# Altium footprint library 集大电协1.5.PcbLib: 227 footprints (part 14 of 18)
Each footprint in its own frame and in the unit in brackets; x right, y up, seen from the top. Pads: shape width x height; smd on the part's side, far side on the other; paste and mask are expansions set on the pad; w line width, h text height; cw(c..) or ccw(c..) is an arc to the next point about the centre after c.
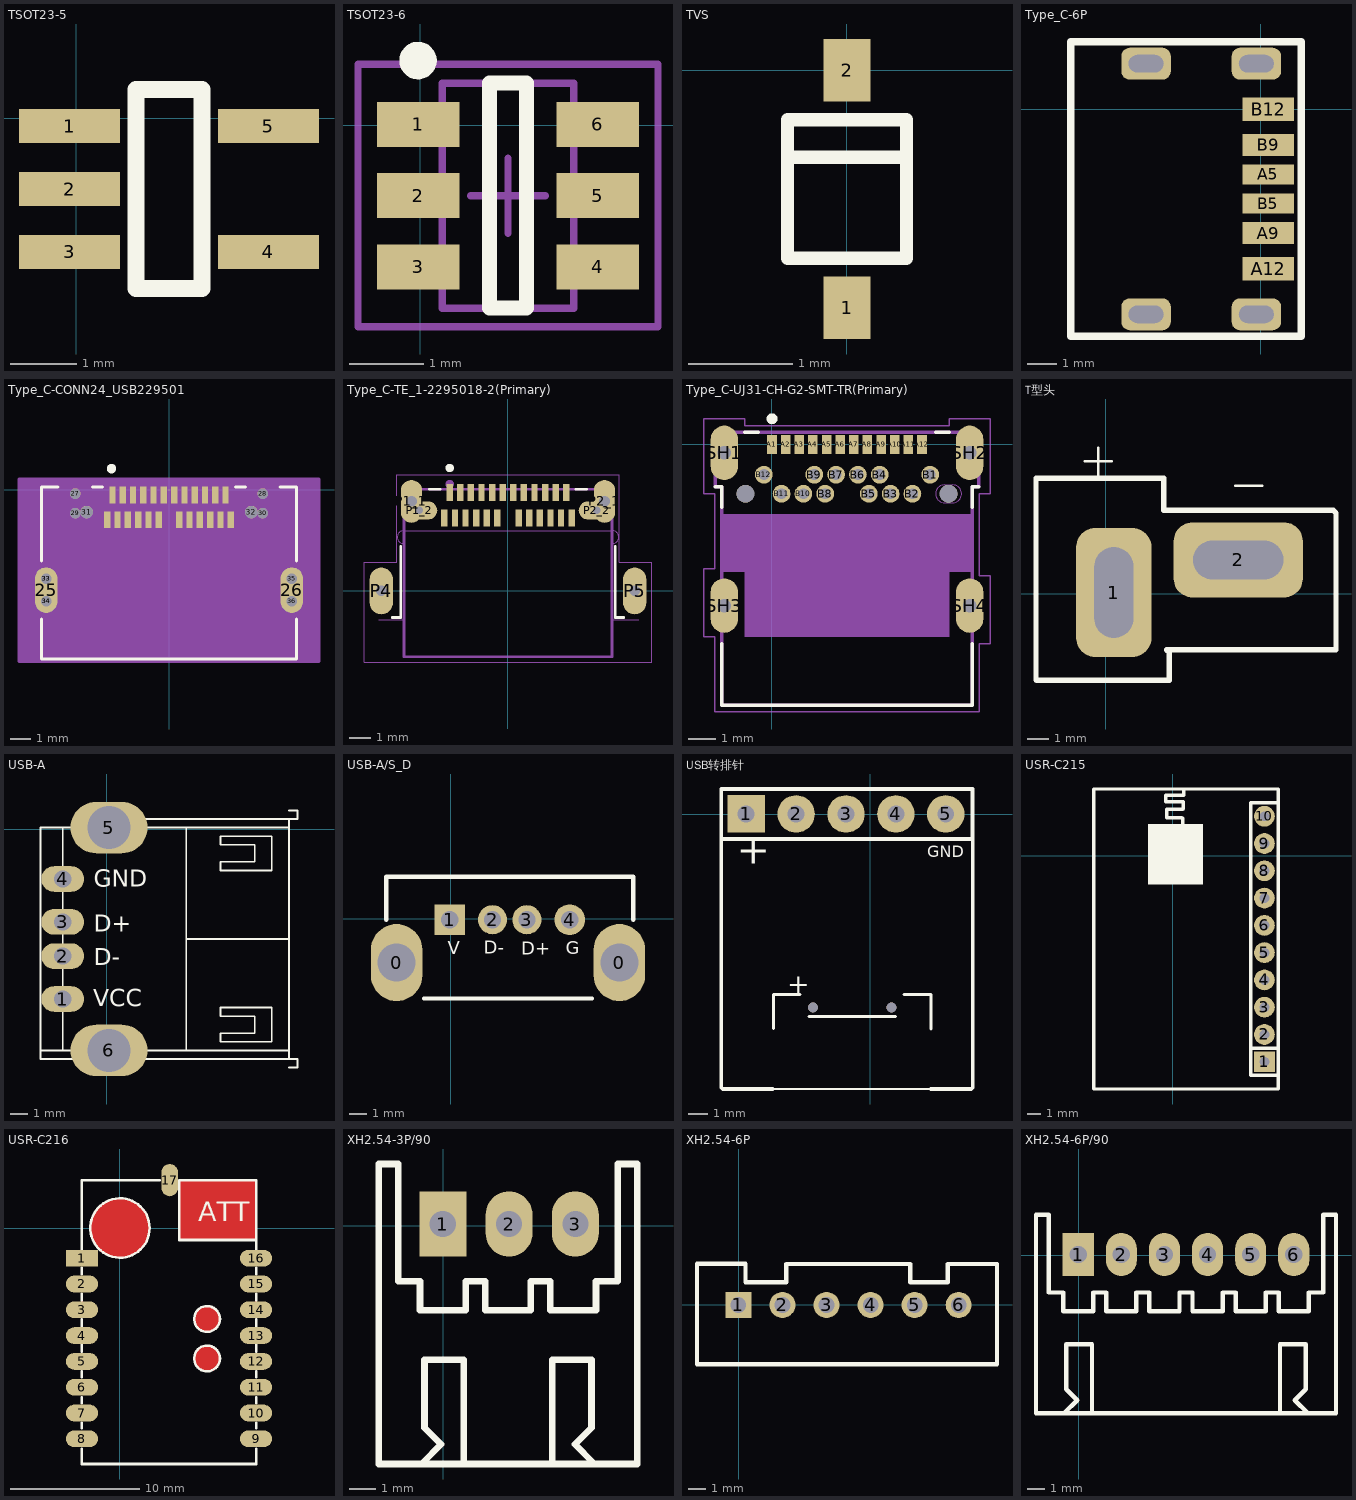
[diagram p13: the footprints below, top view; thin cyan lines are the x and y axes]

## TSOT23-5 [mil]
pads (5):
  rect 60x20 smd: 1(-4.06,-4.53) 2(-4.06,-41.93) 3(-4.06,-79.33) 4(114.06,-79.33) 5(114.06,-4.53)
Top Overlay:
  lines w10: 35.31,-100.98 35.31,17.13 74.69,17.13 74.69,-100.98 35.31,-100.98
3D body: height 47.24, standoff 0, extent 1,-98.09 111.23,16.09

## TSOT23-6 [mm]
pads (6):
  rect 1.1x0.6 smd: 1(-0.032,0.01) 2(-0.032,-0.94) 3(-0.032,-1.89) 4(2.368,-1.89) 5(2.368,-0.94) 6(2.368,0.01)
Top Overlay:
  circle w0.25: c-0.032,0.86 r0.125
  lines w0.2: 0.918,-2.44 1.418,-2.44 1.418,0.56 0.918,0.56 0.918,-2.44
Mechanical 13:
  lines w0.1: 0.293,-2.44 0.293,0.56 2.043,0.56 2.043,-2.44 0.293,-2.44
Mechanical 15:
  lines w0.1: 0.668,-0.94 1.668,-0.94 ; 1.168,-1.44 1.168,-0.44 ; -0.832,-2.69 -0.832,0.81 3.168,0.81 3.168,-2.69 -0.832,-2.69
3D body: height 1.45, standoff 0, extent 0.293,-2.44 2.043,0.56

## TVS [mm]
pads (2):
  rect 0.45x0.6 smd: 1(0.003,-2.286) 2(0.003,0)
Top Overlay:
  lines w0.127: -0.555,-0.838 0.562,-0.838 ; -0.57,-1.809 0.576,-1.809 0.576,-0.477 -0.57,-0.477 -0.57,-1.809
3D body "SOD-323.STEP": height 1, standoff 0, extent -0.65,-2.45 0.65,0.15

## Type_C-6P [mm]
pads (10):
  rect 1.778x0.7 smd: A5(0.254,-2.25) B5(0.254,-3.25)
  rect 1.778x0.76 smd: A9(0.254,-4.27) B9(0.254,-1.23)
  rect 1.778x0.8 smd: A12(0.254,-5.5) B12(0.254,0)
  rrect50% 1.7x1.1 hole 0.6 slot 1.2 at 0 deg: ""(-3.95,-7.07) ""(-3.95,1.57) ""(-0.15,-7.07) ""(-0.15,1.57)
Top Overlay:
  lines w0.254: -6.547,-7.83 -6.547,2.33 1.397,2.33 1.397,-7.83 -6.547,-7.83
3D body "USB TYPE-C 3.1smple.STEP": height 3.18, standoff -0.9, extent -6.589,-7.22 0.311,1.72

## Type_C-CONN24_USB229501 [mil]
pads (38):
  oval 43x87 smd: 25(-235.04,-192.52) 26(235.04,-192.52)
  round 20 hole 20: 27(-179.13,-7.68) 28(179.13,-7.68) 29(-179.13,-45.12) 30(179.13,-45.12) 33(-235.04,-171.02) 33(-235.04,-171.02) 34(-235.04,-214.02) 34(-235.04,-214.02) 35(235.04,-171.02) 36(235.04,-214.02)
  round 24 hole 24: 31(-157.48,-43.11) 32(157.48,-43.11)
  rect 12x32 smd paste+0 mask+0: A1(-108.27,-10.47) A2(-88.58,-10.47) A3(-68.9,-10.47) A4(-49.21,-10.47) A5(-29.53,-10.47) A6(-9.84,-10.47) A7(9.84,-10.47) A8(29.53,-10.47) A9(49.21,-10.47) A10(68.9,-10.47) A11(88.58,-10.47) A12(108.27,-10.47) B1(118.11,-57.72) B2(98.43,-57.72) B3(78.74,-57.72) B4(59.06,-57.72) B5(39.37,-57.72) B6(19.68,-57.72) B7(-19.68,-57.72) B8(-39.37,-57.72) B9(-59.06,-57.72) B10(-78.74,-57.72) B11(-98.43,-57.72) B12(-118.11,-57.72)
Top Overlay:
  circle w10: c-110,40 r4
  lines w6: -244,-247.94 -244,-324 244,-324 244,-247.94 ; -244,-137.1 -244,5 -212.23,5 ; -146.03,5 -127.1,5 ; 127.1,5 146.03,5 ; 212.23,5 244,5 244,-137.1
Bottom Overlay:
  circle w10: c-110,40 r4
Mechanical 13:
  circle w5: c-110,40 r4
  lines w1: -239,-319 -239,0 239,0 239,-319 -239,-319
Mechanical 15:
  region: 287,20 -287,20 -287,-329 287,-329
  region: 239,0 -239,0 -239,-319 239,-319
  lines w6: -287,-329 287,-329 287,20 -287,20 -287,-329
Multi-Layer:
  lines w1: -189.13,-45.12 -189.13,-7.68 ; -179.13,-55.12 -157.48,-55.11 ; -169.13,-7.68 -169.13,-31.11 -157.48,-31.11 ; 157.48,-55.11 179.13,-55.12 ; 157.48,-31.11 169.13,-31.11 169.13,-7.68 ; 189.13,-45.12 189.13,-7.68 ; -245.04,-214.02 -245.04,-171.02 -245.04,-214.02 ; -225.04,-214.02 -225.04,-171.02 -225.04,-214.02 ; -194,-319 194,-319 194,-91 -194,-91 -194,-319 ; 225.04,-214.02 225.04,-171.02 225.04,-214.02 ; 245.04,-214.02 245.04,-171.02 245.04,-214.02
3D body "c-2295018-2-a-3d.stp": height 96.06, standoff -45.67, extent -238.97,-315.86 238.99,2.84

## Type_C-TE_1-2295018-2(Primary) [mm]
pads (30):
  rect 0.3x0.8 smd: A1(-2.75,4.63) A2(-2.25,4.63) A3(-1.75,4.63) A4(-1.25,4.63) A5(-0.75,4.63) A6(-0.25,4.63) A7(0.25,4.63) A8(0.75,4.63) A9(1.25,4.63) A10(1.75,4.63) A11(2.25,4.63) A12(2.75,4.63) B1(3,3.43) B2(2.5,3.43) B3(2,3.43) B4(1.5,3.43) B5(1,3.43) B6(0.5,3.43) B7(-0.5,3.43) B8(-1,3.43) B9(-1.5,3.43) B10(-2,3.43) B11(-2.5,3.43) B12(-3,3.43)
  oval 1.008x2.016 hole 0.5: P1_1(-4.55,4.22) P2_1(4.55,4.22)
  oval 1.716x0.858 hole 0.35: P1_2(-4.191,3.795) P2_2(4.191,3.795)
  oval 1.1x2.2 hole 0.5: P4(-5.97,0) P5(5.97,0)
Top Overlay:
  circle w0.2: c-2.75,5.795 r0.1
  lines w0.127: -5.45,-1.25 -5.05,-1.25 -5.05,2.1 ; -3.7,4.795 -3.2,4.795 ; 3.2,4.795 3.7,4.795 ; 5.05,2.1 5.05,-1.25 5.45,-1.25
Mechanical 1:
  lines w0: -6.09,-1.36 -4.92,-1.36 -4.92,2.24 cw(c-4.92,2.54) -5.22,2.54 cw(c-4.92,2.54) -4.92,2.84 4.93,2.84 cw(c4.925,2.545) 5.22,2.54 ; -4.3,4.25 -4.3,4.695 ccw(c-4.55,4.695) -4.55,4.945 ccw(c-4.55,4.695) -4.8,4.695 -4.8,3.745 ccw(c-4.55,3.745) -4.55,3.495 -4,3.495 ccw(c-4,3.795) -3.7,3.795 ; -4.3,4.25 ccw(c-4.15,4.245) -4.155,4.095 -4.005,4.095 ; -4.002,4.095 cw(c-4.002,3.792) -3.7,3.792 ; 4.3,4.25 4.3,4.695 cw(c4.55,4.695) 4.55,4.945 cw(c4.55,4.695) 4.8,4.695 4.8,3.745 cw(c4.55,3.745) 4.55,3.495 4,3.495 cw(c4,3.795) 3.7,3.795 cw(c4,3.795) 4,4.095 4.155,4.095 ccw(c4.15,4.245) 4.3,4.25 ; 4.919,2.24 ccw(c4.929,2.531) 5.22,2.541 ; 4.92,2.24 4.92,-1.36 6.17,-1.36 ; -6.22,-0.55 ccw(c-5.97,-0.55) -5.97,-0.8 ccw(c-5.97,-0.55) -5.72,-0.55 -5.72,0.55 ccw(c-5.97,0.55) -5.97,0.8 ccw(c-5.97,0.55) -6.22,0.55 -6.22,-0.55 ; 5.72,-0.55 ccw(c5.97,-0.55) 5.97,-0.8 ccw(c5.97,-0.55) 6.22,-0.55 6.22,0.55 ccw(c5.97,0.55) 5.97,0.8 ccw(c5.97,0.55) 5.72,0.55 5.72,-0.55
Mechanical 4:
  circle w0.2: c-2.75,5.035 r0.1
  circle w0.2: c-2.75,5.035 r0.1
  lines w0.127: -4.9,-3.105 -4.9,4.795 ; -4.9,-3.105 4.9,-3.105 ; -4.9,-3.105 -4.9,4.795 ; -4.9,-3.105 4.9,-3.105 ; -4.9,4.795 4.9,4.795 ; -4.9,4.795 4.9,4.795 ; 4.9,-3.105 4.9,4.795 ; 4.9,-3.105 4.9,4.795
Mechanical 16:
  lines w0.05: -6.77,-3.355 -6.77,1.35 -5.25,1.35 -5.25,5.48 5.25,5.48 5.25,1.35 6.77,1.35 6.77,-3.355 -6.77,-3.355
3D body "c-1-2295018-2-a-3d.stp": height 2.5, standoff -1.1, extent -6.07,-3.142 6.07,4.953

## Type_C-UJ31-CH-G2-SMT-TR(Primary) [mm]
pads (30):
  rect 0.35x0.7 smd: A1(0,0) A2(0.5,0) A3(1,0) A4(1.5,0) A5(2,0) A6(2.5,0) A7(3,0) A8(3.5,0) A9(4,0) A10(4.5,0) A11(5,0) A12(5.5,0)
  round 0.65 hole 0.4: B1(5.8,-1.11) B2(5.15,-1.81) B3(4.35,-1.81) B4(3.95,-1.11) B5(3.55,-1.81) B6(3.15,-1.11) B7(2.35,-1.11) B8(1.95,-1.81) B9(1.55,-1.11) B10(1.15,-1.81) B11(0.35,-1.81) B12(-0.3,-1.11)
  round 0.65 hole 0.65 unplated: None(-0.975,-1.81) None(6.475,-1.81)
  oval 1x2 hole 0.5: SH1(-1.75,-0.31) SH2(7.25,-0.31) SH3(-1.75,-5.91) SH4(7.25,-5.91)
Top Overlay:
  circle w0.2: c0,0.94 r0.1
  lines w0.127: -2.075,-1.56 -1.85,-1.56 -1.85,-2.31 ; -1.85,-7.31 -1.85,-9.56 7.35,-9.56 7.35,-7.31 ; -1,0.44 -0.5,0.44 ; 6,0.44 6.5,0.44 ; 7.35,-2.31 7.35,-1.56 7.575,-1.56
Mechanical 1:
  lines w0: -2,-6.31 ccw(c-1.75,-6.31) -1.5,-6.31 -1.5,-5.51 ccw(c-1.75,-5.51) -2,-5.51 -2,-6.31 ; -2,-0.61 ccw(c-1.75,-0.61) -1.5,-0.61 -1.5,-0.01 ccw(c-1.75,-0.01) -2,-0.01 -2,-0.61 ; 6.325,-2.135 cw(c6.325,-1.81) 6.325,-1.485 6.625,-1.485 cw(c6.625,-1.81) 6.625,-2.135 6.325,-2.135 ; 7,-6.31 ccw(c7.25,-6.31) 7.5,-6.31 7.5,-5.51 ccw(c7.25,-5.51) 7,-5.51 7,-6.31 ; 7,-0.61 ccw(c7.25,-0.61) 7.5,-0.61 7.5,-0.01 ccw(c7.25,-0.01) 7,-0.01 7,-0.61
Mechanical 4:
  region: -1.85,-2.56 7.35,-2.56 7.35,-4.66 6.5,-4.66 6.5,-7.06 -1,-7.06 -1,-4.66 -1.85,-4.66
  region: -1.85,-2.56 7.35,-2.56 7.35,-4.66 6.5,-4.66 6.5,-7.06 -1,-7.06 -1,-4.66 -1.85,-4.66
  region: -1.85,-2.56 7.35,-2.56 7.35,-4.66 6.5,-4.66 6.5,-7.06 -1,-7.06 -1,-4.66 -1.85,-4.66
  region: -1.85,-2.56 7.35,-2.56 7.35,-4.66 6.5,-4.66 6.5,-7.06 -1,-7.06 -1,-4.66 -1.85,-4.66
  lines w0.127: -2.075,-1.56 -2.075,0.44 ; -2.075,-1.56 -1.85,-1.56 ; -2.075,-1.56 -2.075,0.44 ; -2.075,-1.56 -1.85,-1.56 ; -2.075,0.44 7.575,0.44 ; -2.075,0.44 7.575,0.44 ; -1.85,-9.56 -1.85,-1.56 ; -1.85,-9.56 7.35,-9.56 ; -1.85,-9.56 -1.85,-1.56 ; -1.85,-9.56 7.35,-9.56 ; 7.35,-9.56 7.35,-1.56 ; 7.35,-9.56 7.35,-1.56 ; 7.35,-1.56 7.575,-1.56 ; 7.35,-1.56 7.575,-1.56 ; 7.575,-1.56 7.575,0.44 ; 7.575,-1.56 7.575,0.44
Mechanical 16:
  lines w0.05: -2.5,-7.06 -2.5,-4.56 -2.1,-4.56 -2.1,-1.81 -2.5,-1.81 -2.5,0.94 -1,0.94 -1,0.69 6.5,0.69 6.5,0.94 8,0.94 8,-1.81 7.6,-1.81 7.6,-4.81 8,-4.81 8,-7.31 7.6,-7.31 7.6,-9.81 -2.1,-9.81 -2.1,-7.06 -2.5,-7.06
3D body "CUI_UJ31-CH-G2-SMT-TR.step": height 4.5, standoff -1.16, extent -2.062,-9.612 7.65,0.388

## T型头 [mm]
pads (2):
  rrect50% 3.5x6 hole 1.8 slot 4.2 at 90 deg: 1(0.373,0.053)
  rrect50% 6x3.5 hole 1.8 slot 4.2 at 0 deg: 2(6.157,1.566)
Top Overlay:
  lines w0.1: -0.986,6.154 0.284,6.154 ; -0.351,5.519 -0.351,6.789 ; 5.999,5.011 7.269,5.011
  lines w0.254: -3.243,-4.006 -3.243,5.366 2.697,5.366 2.697,3.868 10.571,3.868 10.698,3.741 10.698,-2.609 2.824,-2.609 2.951,-2.736 2.951,-4.034 -3.215,-4.034 -3.243,-4.006
3D body "User Library-Deans.step": height 14.1, standoff -4.9, extent -2.665,-3.157 9.335,4.143

## USB-A [mm]
pads (6):
  oval 2.5x1.5 hole 1: 1(-2.569,-9.89) 2(-2.569,-7.39) 3(-2.569,-5.39) 4(-2.569,-2.89)
  oval 4.5x3 hole 2.5: 5(0.131,0.11) 6(0.131,-12.89)
Top Overlay:
  lines w0.1: -3.869,-12.89 0.131,-12.89 ; -2.569,-12.89 -2.569,0.11 ; -0.869,0.61 10.631,0.61 ; 0.131,-13.39 0.131,-12.89 ; 0.131,0.61 0.131,0.11 10.631,0.11 -2.569,0.11 ; 4.631,-12.89 4.631,0.11 ; 4.631,-6.39 10.631,-6.39 10.631,0.61 ; 10.631,-13.89 11.131,-13.89 11.131,-13.39 10.631,-13.39 ; 10.631,-12.89 0.131,-12.89 ; 10.631,1.11 11.131,1.11 11.131,0.61 10.631,0.61 ; -2.569,0.11 -3.869,0.11 -3.869,-6.39 -3.869,-13.39 10.631,-13.39 ; 10.631,-13.39 10.631,0.61 ; 6.631,-12.39 6.631,-11.89 8.631,-11.89 8.631,-10.89 6.631,-10.89 6.631,-10.39 9.631,-10.39 9.631,-11.89 9.631,-12.39 6.631,-12.39 ; 6.631,-2.39 6.631,-1.89 8.631,-1.89 8.631,-0.89 6.631,-0.89 6.631,-0.39 9.631,-0.39 9.631,-1.89 9.631,-2.39 6.631,-2.39
  text "VCC" at -0.8,-10.325 h1
  text "GND" at -0.75,-3.35 h1
  text "D+" at -0.75,-5.975 h1
  text "D-" at -0.75,-7.925 h1
Bottom Overlay:
  lines w0.1: -3.869,-12.89 10.631,-12.89 ; -2.569,-12.89 -2.569,0.11 ; 4.631,-6.39 10.631,-6.39 ; 10.631,-13.89 11.131,-13.89 11.131,-13.39 -3.869,-13.39 -3.869,0.11 ; 10.631,-13.39 10.631,-12.89 ; 10.631,1.11 11.131,1.11 11.131,0.61 10.631,0.61 ; -3.869,0.11 -3.869,0.61 10.631,0.61 ; -3.869,0.11 10.631,0.11 10.631,0.61 ; 10.631,-12.89 10.631,0.61
3D body "USB-A_SA.STEP": height 6.8, standoff -4.31, extent -3.325,-13.742 10.98,0.942

## USB-A/S_D [mm]
pads (6):
  oval 3x4.5 hole 2.2: 0(-3.169,-2.548) 0(9.831,-2.548)
  rect 1.8x1.8 hole 1: 1(-0.069,-0.048)
  round 1.7 hole 1: 2(2.431,-0.048) 3(4.431,-0.048)
  round 1.8 hole 1: 4(6.931,-0.048)
Top Overlay:
  lines w0.254: -3.769,-0.048 -3.769,2.452 10.631,2.452 10.631,-0.048 ; -1.569,-4.648 8.231,-4.648
  text "D-" at 1.927,-2.029 h0.76
  text "D+" at 4.112,-2.08 h0.76
  text "G" at 6.702,-2.055 h0.76
  text "V" at -0.181,-2.055 h0.76
Mechanical 1:
  lines w0.254: -0.269,-0.248 cw(c-0.069,-0.248) -0.069,-0.048
3D body "USB-A_S-D.STEP": height 14, standoff -4, extent -3.713,-4.635 10.687,2.365

## USB转排针 [mm]
pads (7):
  rect 1.905x1.905 hole 0.864: 1(-6.316,0.014)
  round 1.905 hole 0.864: 2(-3.776,0.014) 3(-1.236,0.014) 4(1.304,0.014) 5(3.839,0.014)
  round 0.5 hole 0.5 unplated: ""(-2.923,-9.834) ""(1.077,-9.834)
Top Overlay:
  lines w0.1: -4.973,-13.984 3.077,-13.984
  lines w0.152: -4.923,-10.9 -4.923,-9.184 -3.573,-9.184 ; -3.123,-10.284 1.277,-10.284 ; 1.727,-9.184 3.077,-9.184 3.077,-10.934
  lines w0.2: -4.973,-13.984 -7.502,-13.984 -7.586,-13.9 -7.586,-1.256 ; 3.077,-13.984 5.13,-13.984 ; 5.214,-13.9 5.214,-1.256 ; -7.586,-1.256 5.2,-1.256 5.2,1.284 -7.586,1.284 -7.586,-1.256
  text "GND" at 2.9,-2.4 h1.02
  text "+" at -4.223,-9.134 h1
  text "+" at -6.8,-3 h2.54
3D body "MICRO-USB.stp": height 2.47, standoff -0.92, extent -4.875,-14.1 3.075,-8.324
3D body "HDR1X5_2.54mm.STEP": height 8.54, standoff -3, extent -7.591,-1.256 5.109,1.284

## USR-C215 [mil]
pads (10):
  rect 60x60 hole 28: 1(264.14,-593.99)
  round 60 hole 28: 2(264.14,-515.25) 3(264.14,-436.51) 4(264.14,-357.77) 5(264.14,-279.03) 6(264.14,-200.29) 7(264.14,-121.55) 8(264.14,-42.81) 9(264.14,35.93) 10(264.14,114.67)
Top Overlay:
  circle w10: c16.75,46.74 r32.8
  rectangle: -71.86,-81.99 86.14,92.01
  lines w10: 27.75,80.74 27.75,108.74 25.75,110.74 -18.25,110.74 -18.25,134.74 28.75,134.74 29.75,135.74 29.75,156.74 -20.25,156.74 -20.25,174.74 31.75,174.74 31.75,190.74 ; 224.77,-554.62 303.51,-554.62 ; -227.99,-672.73 -227.99,193.41 303.51,193.41 303.51,-672.73 -227.99,-672.73 ; 224.77,-633.36 224.77,154.04 303.51,154.04 303.51,-633.36 224.77,-633.36
3D body: height 30, standoff 0, extent -227,-672 303,193
3D body: height 40, standoff 30, extent -72,-83 85,90
3D body: height 40, standoff 10, extent -22.25,9.74 53.75,84.74

## USR-C216 [mm] "有人公司WIFI模组 USR-C216"
pads (17):
  rect 2.5x1.3 smd: 1(-2.945,-2.325)
  oval 2.5x1.3 smd: 2(-2.945,-4.325) 3(-2.945,-6.325) 4(-2.945,-8.325) 5(-2.945,-10.325) 6(-2.945,-12.325) 7(-2.945,-14.325) 8(-2.945,-16.325) 9(10.555,-16.325) 10(10.555,-14.325) 11(10.555,-12.325) 12(10.555,-10.325) 13(10.555,-8.325) 14(10.555,-6.325) 15(10.555,-4.325) 16(10.555,-2.325)
  oval 1.3x2.5 smd: 17(3.855,3.725)
Top Layer:
  pour cut-out: 6.755,-9.085 6.853,-9.085 7.047,-9.123 7.229,-9.199 7.392,-9.308 7.532,-9.448 7.641,-9.611 7.717,-9.793 7.755,-9.987 7.755,-10.085 7.755,-10.105 7.755,-10.203 7.717,-10.397 7.641,-10.579 7.532,-10.742 7.392,-10.882 7.229,-10.991 7.047,-11.067 6.853,-11.105 6.755,-11.105 6.657,-11.105 6.463,-11.067 6.281,-10.991 6.118,-10.882 5.978,-10.742 5.869,-10.579 5.793,-10.397 5.755,-10.203 5.755,-10.105 5.755,-10.085 5.755,-9.987 5.793,-9.793 5.869,-9.611 5.978,-9.448 6.118,-9.308 6.281,-9.199 6.463,-9.123 6.657,-9.085
  pour cut-out: 6.755,-6.035 6.853,-6.035 7.047,-6.073 7.229,-6.149 7.392,-6.258 7.532,-6.398 7.641,-6.561 7.717,-6.743 7.755,-6.937 7.755,-7.035 7.755,-7.133 7.717,-7.327 7.641,-7.509 7.532,-7.672 7.392,-7.812 7.229,-7.921 7.047,-7.997 6.853,-8.035 6.755,-8.035 6.657,-8.035 6.463,-7.997 6.281,-7.921 6.118,-7.812 5.978,-7.672 5.869,-7.509 5.793,-7.327 5.755,-7.133 5.755,-7.035 5.755,-7.025 5.755,-6.927 5.793,-6.736 5.868,-6.556 5.976,-6.394 6.114,-6.256 6.276,-6.148 6.456,-6.073 6.647,-6.035 6.745,-6.035
  pour cut-out: 4.611,3.725 4.611,-0.905 10.555,-0.905 10.555,3.725
  pour cut-out: 0.015,2.305 0.241,2.305 0.683,2.217 1.1,2.044 1.475,1.794 1.794,1.475 2.044,1.1 2.217,0.683 2.305,0.241 2.305,0.015 2.305,-0.212 2.217,-0.656 2.043,-1.074 1.792,-1.451 1.471,-1.772 1.094,-2.023 0.676,-2.197 0.232,-2.285 0.005,-2.285 -0.015,-2.285 -0.241,-2.285 -0.683,-2.197 -1.1,-2.024 -1.475,-1.774 -1.794,-1.455 -2.044,-1.08 -2.217,-0.663 -2.305,-0.221 -2.305,0.005 -2.305,0.025 -2.305,0.25 -2.217,0.69 -2.046,1.105 -1.796,1.478 -1.478,1.796 -1.105,2.046 -0.69,2.217 -0.25,2.305 -0.025,2.305
Top Overlay:
  circle w0.2: c6.755,-7.035 r1
  circle w0.2: c6.755,-10.095 r1
  circle w0.2: c0.005,0.015 r2.3
  lines w0.203: -2.945,-17.081 -2.945,-18.275 10.555,-18.275 10.555,-17.081 ; -2.945,-15.506 -2.945,-15.075 ; -2.945,-13.576 -2.945,-13.093 ; -2.945,-11.544 -2.945,-11.087 ; -2.945,-9.588 -2.945,-9.055 ; -2.945,-7.582 -2.945,-7.074 ; -2.945,-5.6 -2.945,-5.067 ; -2.945,-3.568 -2.945,-3.086 ; -2.945,-1.638 -2.945,3.725 3.087,3.725 ; 10.555,-15.506 10.555,-15.075 ; 10.555,-13.576 10.555,-13.093 ; 10.555,-11.544 10.555,-11.087 ; 10.555,-9.588 10.555,-9.055 ; 10.555,-7.582 10.555,-7.074 ; 10.555,-5.6 10.555,-5.067 ; 10.555,-3.568 10.555,-3.086 ; 10.555,-1.638 10.555,3.725 4.611,3.725 4.611,-0.915 10.555,-0.915
  text "ATT" at 6.059,0.525 h1.52
3D body: height 1, standoff 0, extent -3.035,-18.185 10.535,3.725

## XH2.54-3P/90 [mm]
pads (3):
  rect 1.8x2.5 hole 1: 1(-0.02,0.065)
  oval 1.8x2.5 hole 1: 2(2.52,0.065) 3(5.06,0.065)
Top Overlay:
  lines w0.254: -0.81,-9.107 -0.083,-8.381 -0.72,-7.744 -0.72,-5.135 0.78,-5.135 0.78,-9.135 ; 4.18,-9.135 4.18,-5.135 5.68,-5.135 5.68,-7.744 5.044,-8.381 5.77,-9.107 ; -2.47,-9.135 7.43,-9.135 7.43,2.365 6.68,2.365 6.68,-2.135 5.855,-2.135 5.855,-3.235 4.105,-3.235 4.105,-2.135 3.355,-2.135 3.355,-3.235 1.605,-3.235 1.605,-2.135 0.855,-2.135 0.855,-3.235 -0.895,-3.235 -0.895,-2.135 -1.72,-2.135 -1.72,2.365 -2.47,2.365 -2.47,-9.135
3D body "JST-S3B-XH-A.STEP": height 6.1, standoff -3.4, extent -2.47,-9.135 7.43,2.365

## XH2.54-6P [mm]
pads (6):
  rect 1.5x1.5 hole 0.9: 1(-0.018,-0.022)
  round 1.5 hole 0.9: 2(2.522,-0.022) 3(5.062,-0.022) 4(7.602,-0.022) 5(10.142,-0.022) 6(12.682,-0.022)
Top Overlay:
  lines w0.254: -2.406,-3.451 14.891,-3.451 14.891,2.34 12.047,2.34 12.047,1.299 9.888,1.299 9.888,2.34 2.75,2.34 2.75,1.299 0.388,1.299 0.388,2.366 -2.406,2.366 -2.406,-3.451
3D body "6pin-2.5.step": height 7, standoff -3.4, extent -2.495,-3.405 14.905,2.345

## XH2.54-6P/90 [mm]
pads (6):
  rect 1.8x2.5 hole 1: 1(-0.015,0.035)
  oval 1.8x2.5 hole 1: 2(2.485,0.035) 3(4.985,0.035) 4(7.485,0.035) 5(9.985,0.035) 6(12.485,0.035)
Top Overlay:
  lines w0.254: -0.805,-9.137 -0.079,-8.41 -0.715,-7.774 -0.715,-5.165 0.785,-5.165 0.785,-9.165 ; 11.685,-9.165 11.685,-5.165 13.185,-5.165 13.185,-7.774 12.548,-8.41 13.275,-9.137 ; -2.465,-9.165 14.935,-9.165 14.935,2.335 14.185,2.335 14.185,-2.165 13.36,-2.165 13.36,-3.265 11.61,-3.265 11.61,-2.165 10.86,-2.165 10.86,-3.265 9.11,-3.265 9.11,-2.165 8.36,-2.165 8.36,-3.265 6.61,-3.265 6.61,-2.165 5.86,-2.165 5.86,-3.265 4.11,-3.265 4.11,-2.165 3.36,-2.165 3.36,-3.265 1.61,-3.265 1.61,-2.165 0.86,-2.165 0.86,-3.265 -0.89,-3.265 -0.89,-2.165 -1.715,-2.165 -1.715,2.335 -2.465,2.335 -2.465,-9.165
3D body "JST-S6B-XH-A.STEP": height 6.1, standoff -3.4, extent -2.465,-9.165 14.935,2.335